# Altium schematic symbol library Regulator_Linear.SchLib: 1538 symbols (part 2 of 9)
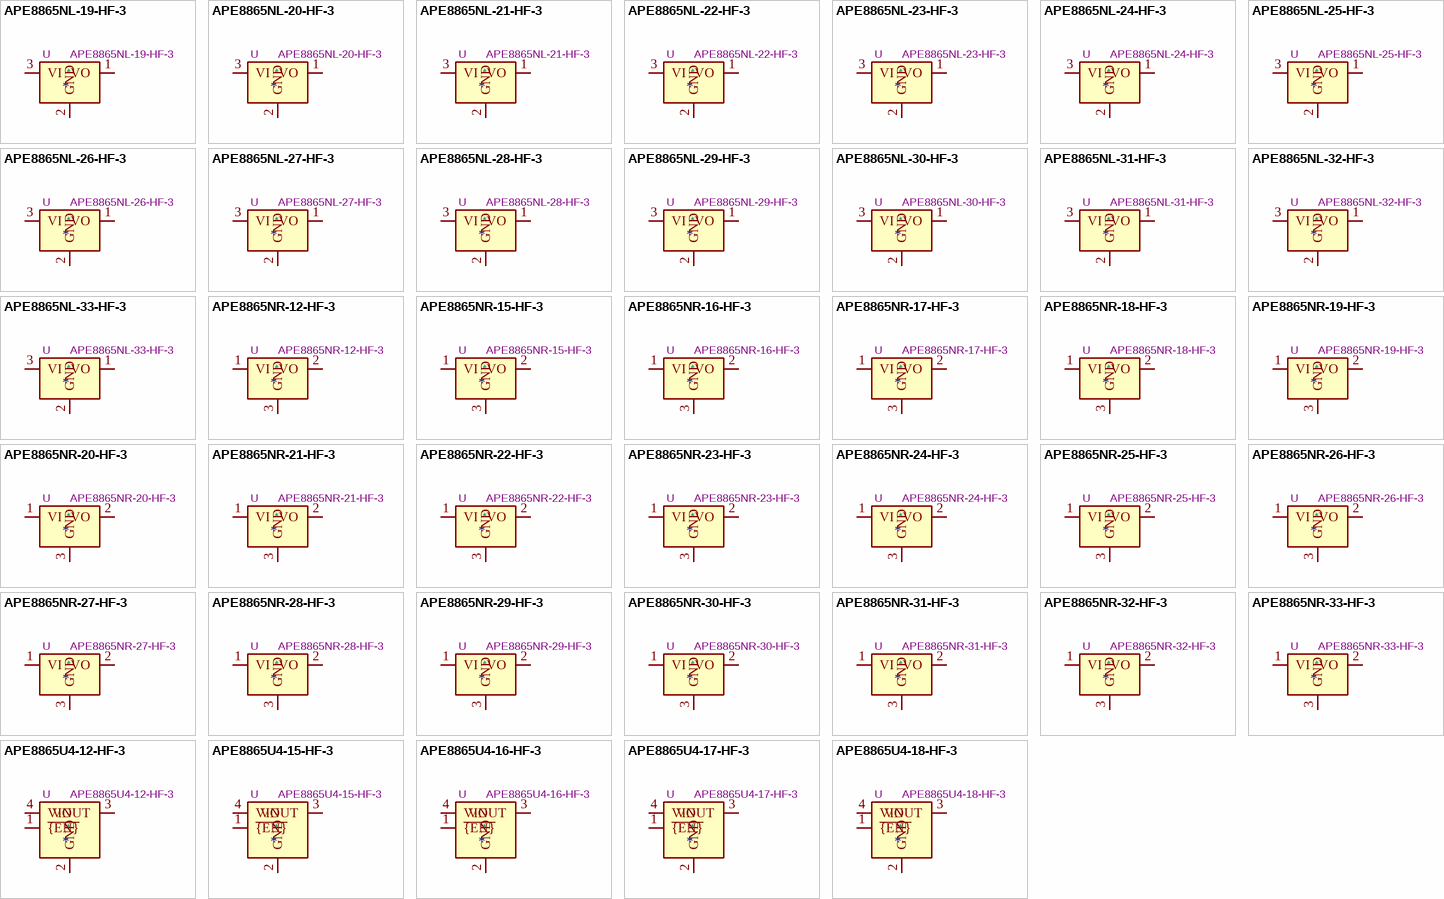
[diagram p39: symbols APE8865NL-19-HF-3 to APE8865U4-18-HF-3]

## APE8865NR-19-HF-3
designator *  value APE8865NR-19-HF-3  Reference: U
ki_keywords: 300mA LDO Regulator Fixed Positive; ki_description: 300mA Low Dropout Voltage Regulator, Fixed Output 1.9V, SOT-23; ki_fp_filters: SOT?23*; Footprint: Package_TO_SOT_SMD:SOT-23; Datasheet: http://www.tme.eu/fr/Document/ced3461ed31ea70a3c416fb648e0cde7/APE8865-3.pdf
pins: 1 VI, 2 VO, 3 GND

## APE8865NR-20-HF-3
designator *  value APE8865NR-20-HF-3  Reference: U
ki_keywords: 300mA LDO Regulator Fixed Positive; ki_description: 300mA Low Dropout Voltage Regulator, Fixed Output 2.0V, SOT-23; ki_fp_filters: SOT?23*; Footprint: Package_TO_SOT_SMD:SOT-23; Datasheet: http://www.tme.eu/fr/Document/ced3461ed31ea70a3c416fb648e0cde7/APE8865-3.pdf
pins: 1 VI, 2 VO, 3 GND

## APE8865NR-21-HF-3
designator *  value APE8865NR-21-HF-3  Reference: U
ki_keywords: 300mA LDO Regulator Fixed Positive; ki_description: 300mA Low Dropout Voltage Regulator, Fixed Output 2.1V, SOT-23; ki_fp_filters: SOT?23*; Footprint: Package_TO_SOT_SMD:SOT-23; Datasheet: http://www.tme.eu/fr/Document/ced3461ed31ea70a3c416fb648e0cde7/APE8865-3.pdf
pins: 1 VI, 2 VO, 3 GND

## APE8865NR-22-HF-3
designator *  value APE8865NR-22-HF-3  Reference: U
ki_keywords: 300mA LDO Regulator Fixed Positive; ki_description: 300mA Low Dropout Voltage Regulator, Fixed Output 2.2V, SOT-23; ki_fp_filters: SOT?23*; Footprint: Package_TO_SOT_SMD:SOT-23; Datasheet: http://www.tme.eu/fr/Document/ced3461ed31ea70a3c416fb648e0cde7/APE8865-3.pdf
pins: 1 VI, 2 VO, 3 GND

## APE8865NR-23-HF-3
designator *  value APE8865NR-23-HF-3  Reference: U
ki_keywords: 300mA LDO Regulator Fixed Positive; ki_description: 300mA Low Dropout Voltage Regulator, Fixed Output 2.3V, SOT-23; ki_fp_filters: SOT?23*; Footprint: Package_TO_SOT_SMD:SOT-23; Datasheet: http://www.tme.eu/fr/Document/ced3461ed31ea70a3c416fb648e0cde7/APE8865-3.pdf
pins: 1 VI, 2 VO, 3 GND

## APE8865NR-24-HF-3
designator *  value APE8865NR-24-HF-3  Reference: U
ki_keywords: 300mA LDO Regulator Fixed Positive; ki_description: 300mA Low Dropout Voltage Regulator, Fixed Output 2.4V, SOT-23; ki_fp_filters: SOT?23*; Footprint: Package_TO_SOT_SMD:SOT-23; Datasheet: http://www.tme.eu/fr/Document/ced3461ed31ea70a3c416fb648e0cde7/APE8865-3.pdf
pins: 1 VI, 2 VO, 3 GND

## APE8865NR-25-HF-3
designator *  value APE8865NR-25-HF-3  Reference: U
ki_keywords: 300mA LDO Regulator Fixed Positive; ki_description: 300mA Low Dropout Voltage Regulator, Fixed Output 2.5V, SOT-23; ki_fp_filters: SOT?23*; Footprint: Package_TO_SOT_SMD:SOT-23; Datasheet: http://www.tme.eu/fr/Document/ced3461ed31ea70a3c416fb648e0cde7/APE8865-3.pdf
pins: 1 VI, 2 VO, 3 GND

## APE8865NR-26-HF-3
designator *  value APE8865NR-26-HF-3  Reference: U
ki_keywords: 300mA LDO Regulator Fixed Positive; ki_description: 300mA Low Dropout Voltage Regulator, Fixed Output 2.6V, SOT-23; ki_fp_filters: SOT?23*; Footprint: Package_TO_SOT_SMD:SOT-23; Datasheet: http://www.tme.eu/fr/Document/ced3461ed31ea70a3c416fb648e0cde7/APE8865-3.pdf
pins: 1 VI, 2 VO, 3 GND

## APE8865NR-27-HF-3
designator *  value APE8865NR-27-HF-3  Reference: U
ki_keywords: 300mA LDO Regulator Fixed Positive; ki_description: 300mA Low Dropout Voltage Regulator, Fixed Output 2.7V, SOT-23; ki_fp_filters: SOT?23*; Footprint: Package_TO_SOT_SMD:SOT-23; Datasheet: http://www.tme.eu/fr/Document/ced3461ed31ea70a3c416fb648e0cde7/APE8865-3.pdf
pins: 1 VI, 2 VO, 3 GND

## APE8865NR-28-HF-3
designator *  value APE8865NR-28-HF-3  Reference: U
ki_keywords: 300mA LDO Regulator Fixed Positive; ki_description: 300mA Low Dropout Voltage Regulator, Fixed Output 2.8V, SOT-23; ki_fp_filters: SOT?23*; Footprint: Package_TO_SOT_SMD:SOT-23; Datasheet: http://www.tme.eu/fr/Document/ced3461ed31ea70a3c416fb648e0cde7/APE8865-3.pdf
pins: 1 VI, 2 VO, 3 GND

## APE8865NR-29-HF-3
designator *  value APE8865NR-29-HF-3  Reference: U
ki_keywords: 300mA LDO Regulator Fixed Positive; ki_description: 300mA Low Dropout Voltage Regulator, Fixed Output 2.9V, SOT-23; ki_fp_filters: SOT?23*; Footprint: Package_TO_SOT_SMD:SOT-23; Datasheet: http://www.tme.eu/fr/Document/ced3461ed31ea70a3c416fb648e0cde7/APE8865-3.pdf
pins: 1 VI, 2 VO, 3 GND

## APE8865NR-30-HF-3
designator *  value APE8865NR-30-HF-3  Reference: U
ki_keywords: 300mA LDO Regulator Fixed Positive; ki_description: 300mA Low Dropout Voltage Regulator, Fixed Output 3.0V, SOT-23; ki_fp_filters: SOT?23*; Footprint: Package_TO_SOT_SMD:SOT-23; Datasheet: http://www.tme.eu/fr/Document/ced3461ed31ea70a3c416fb648e0cde7/APE8865-3.pdf
pins: 1 VI, 2 VO, 3 GND

## APE8865NR-31-HF-3
designator *  value APE8865NR-31-HF-3  Reference: U
ki_keywords: 300mA LDO Regulator Fixed Positive; ki_description: 300mA Low Dropout Voltage Regulator, Fixed Output 3.1V, SOT-23; ki_fp_filters: SOT?23*; Footprint: Package_TO_SOT_SMD:SOT-23; Datasheet: http://www.tme.eu/fr/Document/ced3461ed31ea70a3c416fb648e0cde7/APE8865-3.pdf
pins: 1 VI, 2 VO, 3 GND

## APE8865NR-32-HF-3
designator *  value APE8865NR-32-HF-3  Reference: U
ki_keywords: 300mA LDO Regulator Fixed Positive; ki_description: 300mA Low Dropout Voltage Regulator, Fixed Output 3.2V, SOT-23; ki_fp_filters: SOT?23*; Footprint: Package_TO_SOT_SMD:SOT-23; Datasheet: http://www.tme.eu/fr/Document/ced3461ed31ea70a3c416fb648e0cde7/APE8865-3.pdf
pins: 1 VI, 2 VO, 3 GND

## APE8865NR-33-HF-3
designator *  value APE8865NR-33-HF-3  Reference: U
ki_keywords: 300mA LDO Regulator Fixed Positive; ki_description: 300mA Low Dropout Voltage Regulator, Fixed Output 3.3V, SOT-23; ki_fp_filters: SOT?23*; Footprint: Package_TO_SOT_SMD:SOT-23; Datasheet: http://www.tme.eu/fr/Document/ced3461ed31ea70a3c416fb648e0cde7/APE8865-3.pdf
pins: 1 VI, 2 VO, 3 GND

## APE8865U4-12-HF-3
designator *  value APE8865U4-12-HF-3  Reference: U
ki_keywords: 300mA LDO Regulator Fixed Positive; ki_description: 300mA Low Dropout Voltage Regulator, Fixed Output 1.2V, SC-70-4; ki_fp_filters: *SC?70*; Footprint: Package_TO_SOT_SMD:SOT-343_SC-70-4; Datasheet: http://www.tme.eu/fr/Document/ced3461ed31ea70a3c416fb648e0cde7/APE8865-3.pdf
pins: 1 ~{{EN}}, 2 GND, 3 VOUT, 4 VIN

## APE8865U4-15-HF-3
designator *  value APE8865U4-15-HF-3  Reference: U
ki_keywords: 300mA LDO Regulator Fixed Positive; ki_description: 300mA Low Dropout Voltage Regulator, Fixed Output 1.5V, SC-70-4; ki_fp_filters: *SC?70*; Footprint: Package_TO_SOT_SMD:SOT-343_SC-70-4; Datasheet: http://www.tme.eu/fr/Document/ced3461ed31ea70a3c416fb648e0cde7/APE8865-3.pdf
pins: 1 ~{{EN}}, 2 GND, 3 VOUT, 4 VIN

## APE8865U4-16-HF-3
designator *  value APE8865U4-16-HF-3  Reference: U
ki_keywords: 300mA LDO Regulator Fixed Positive; ki_description: 300mA Low Dropout Voltage Regulator, Fixed Output 1.6V, SC-70-4; ki_fp_filters: *SC?70*; Footprint: Package_TO_SOT_SMD:SOT-343_SC-70-4; Datasheet: http://www.tme.eu/fr/Document/ced3461ed31ea70a3c416fb648e0cde7/APE8865-3.pdf
pins: 1 ~{{EN}}, 2 GND, 3 VOUT, 4 VIN

## APE8865U4-17-HF-3
designator *  value APE8865U4-17-HF-3  Reference: U
ki_keywords: 300mA LDO Regulator Fixed Positive; ki_description: 300mA Low Dropout Voltage Regulator, Fixed Output 1.7V, SC-70-4; ki_fp_filters: *SC?70*; Footprint: Package_TO_SOT_SMD:SOT-343_SC-70-4; Datasheet: http://www.tme.eu/fr/Document/ced3461ed31ea70a3c416fb648e0cde7/APE8865-3.pdf
pins: 1 ~{{EN}}, 2 GND, 3 VOUT, 4 VIN

## APE8865U4-18-HF-3
designator *  value APE8865U4-18-HF-3  Reference: U
ki_keywords: 300mA LDO Regulator Fixed Positive; ki_description: 300mA Low Dropout Voltage Regulator, Fixed Output 1.8V, SC-70-4; ki_fp_filters: *SC?70*; Footprint: Package_TO_SOT_SMD:SOT-343_SC-70-4; Datasheet: http://www.tme.eu/fr/Document/ced3461ed31ea70a3c416fb648e0cde7/APE8865-3.pdf
pins: 1 ~{{EN}}, 2 GND, 3 VOUT, 4 VIN

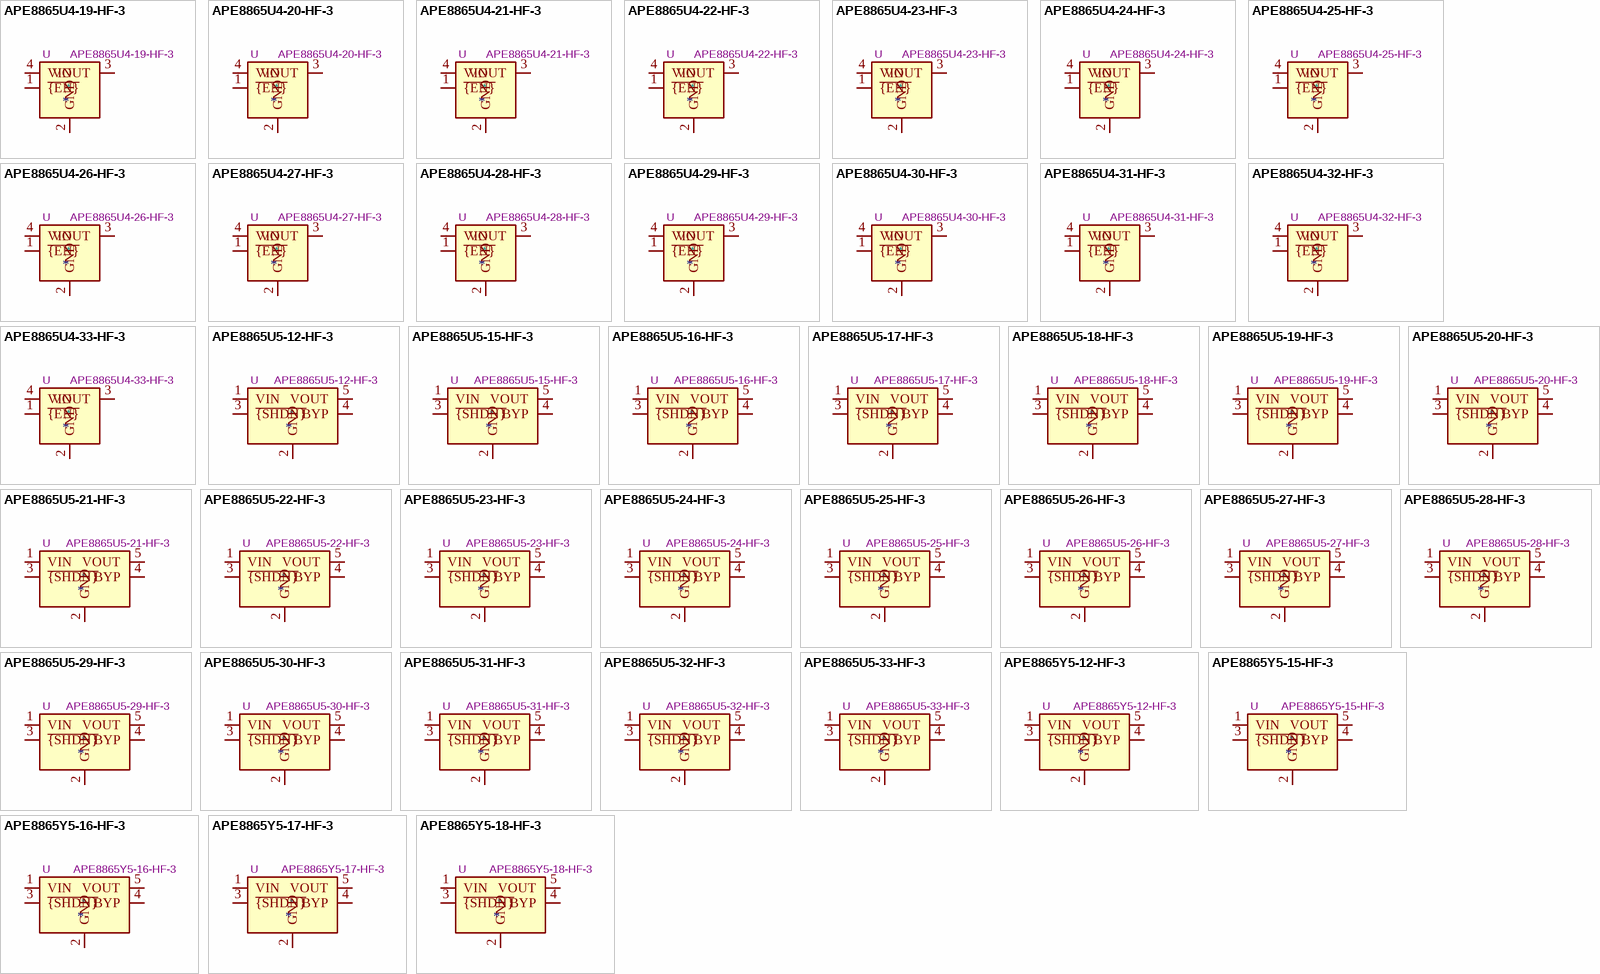
[diagram p5: symbols APE8865U4-19-HF-3 to APE8865Y5-18-HF-3]

## APE8865U4-19-HF-3
designator *  value APE8865U4-19-HF-3  Reference: U
ki_keywords: 300mA LDO Regulator Fixed Positive; ki_description: 300mA Low Dropout Voltage Regulator, Fixed Output 1.9V, SC-70-4; ki_fp_filters: *SC?70*; Footprint: Package_TO_SOT_SMD:SOT-343_SC-70-4; Datasheet: http://www.tme.eu/fr/Document/ced3461ed31ea70a3c416fb648e0cde7/APE8865-3.pdf
pins: 1 ~{{EN}}, 2 GND, 3 VOUT, 4 VIN

## APE8865U4-20-HF-3
designator *  value APE8865U4-20-HF-3  Reference: U
ki_keywords: 300mA LDO Regulator Fixed Positive; ki_description: 300mA Low Dropout Voltage Regulator, Fixed Output 2.0V, SC-70-4; ki_fp_filters: *SC?70*; Footprint: Package_TO_SOT_SMD:SOT-343_SC-70-4; Datasheet: http://www.tme.eu/fr/Document/ced3461ed31ea70a3c416fb648e0cde7/APE8865-3.pdf
pins: 1 ~{{EN}}, 2 GND, 3 VOUT, 4 VIN

## APE8865U4-21-HF-3
designator *  value APE8865U4-21-HF-3  Reference: U
ki_keywords: 300mA LDO Regulator Fixed Positive; ki_description: 300mA Low Dropout Voltage Regulator, Fixed Output 2.1V, SC-70-4; ki_fp_filters: *SC?70*; Footprint: Package_TO_SOT_SMD:SOT-343_SC-70-4; Datasheet: http://www.tme.eu/fr/Document/ced3461ed31ea70a3c416fb648e0cde7/APE8865-3.pdf
pins: 1 ~{{EN}}, 2 GND, 3 VOUT, 4 VIN

## APE8865U4-22-HF-3
designator *  value APE8865U4-22-HF-3  Reference: U
ki_keywords: 300mA LDO Regulator Fixed Positive; ki_description: 300mA Low Dropout Voltage Regulator, Fixed Output 2.2V, SC-70-4; ki_fp_filters: *SC?70*; Footprint: Package_TO_SOT_SMD:SOT-343_SC-70-4; Datasheet: http://www.tme.eu/fr/Document/ced3461ed31ea70a3c416fb648e0cde7/APE8865-3.pdf
pins: 1 ~{{EN}}, 2 GND, 3 VOUT, 4 VIN

## APE8865U4-23-HF-3
designator *  value APE8865U4-23-HF-3  Reference: U
ki_keywords: 300mA LDO Regulator Fixed Positive; ki_description: 300mA Low Dropout Voltage Regulator, Fixed Output 2.3V, SC-70-4; ki_fp_filters: *SC?70*; Footprint: Package_TO_SOT_SMD:SOT-343_SC-70-4; Datasheet: http://www.tme.eu/fr/Document/ced3461ed31ea70a3c416fb648e0cde7/APE8865-3.pdf
pins: 1 ~{{EN}}, 2 GND, 3 VOUT, 4 VIN

## APE8865U4-24-HF-3
designator *  value APE8865U4-24-HF-3  Reference: U
ki_keywords: 300mA LDO Regulator Fixed Positive; ki_description: 300mA Low Dropout Voltage Regulator, Fixed Output 2.4V, SC-70-4; ki_fp_filters: *SC?70*; Footprint: Package_TO_SOT_SMD:SOT-343_SC-70-4; Datasheet: http://www.tme.eu/fr/Document/ced3461ed31ea70a3c416fb648e0cde7/APE8865-3.pdf
pins: 1 ~{{EN}}, 2 GND, 3 VOUT, 4 VIN

## APE8865U4-25-HF-3
designator *  value APE8865U4-25-HF-3  Reference: U
ki_keywords: 300mA LDO Regulator Fixed Positive; ki_description: 300mA Low Dropout Voltage Regulator, Fixed Output 2.5V, SC-70-4; ki_fp_filters: *SC?70*; Footprint: Package_TO_SOT_SMD:SOT-343_SC-70-4; Datasheet: http://www.tme.eu/fr/Document/ced3461ed31ea70a3c416fb648e0cde7/APE8865-3.pdf
pins: 1 ~{{EN}}, 2 GND, 3 VOUT, 4 VIN

## APE8865U4-26-HF-3
designator *  value APE8865U4-26-HF-3  Reference: U
ki_keywords: 300mA LDO Regulator Fixed Positive; ki_description: 300mA Low Dropout Voltage Regulator, Fixed Output 2.6V, SC-70-4; ki_fp_filters: *SC?70*; Footprint: Package_TO_SOT_SMD:SOT-343_SC-70-4; Datasheet: http://www.tme.eu/fr/Document/ced3461ed31ea70a3c416fb648e0cde7/APE8865-3.pdf
pins: 1 ~{{EN}}, 2 GND, 3 VOUT, 4 VIN

## APE8865U4-27-HF-3
designator *  value APE8865U4-27-HF-3  Reference: U
ki_keywords: 300mA LDO Regulator Fixed Positive; ki_description: 300mA Low Dropout Voltage Regulator, Fixed Output 2.7V, SC-70-4; ki_fp_filters: *SC?70*; Footprint: Package_TO_SOT_SMD:SOT-343_SC-70-4; Datasheet: http://www.tme.eu/fr/Document/ced3461ed31ea70a3c416fb648e0cde7/APE8865-3.pdf
pins: 1 ~{{EN}}, 2 GND, 3 VOUT, 4 VIN

## APE8865U4-28-HF-3
designator *  value APE8865U4-28-HF-3  Reference: U
ki_keywords: 300mA LDO Regulator Fixed Positive; ki_description: 300mA Low Dropout Voltage Regulator, Fixed Output 2.8V, SC-70-4; ki_fp_filters: *SC?70*; Footprint: Package_TO_SOT_SMD:SOT-343_SC-70-4; Datasheet: http://www.tme.eu/fr/Document/ced3461ed31ea70a3c416fb648e0cde7/APE8865-3.pdf
pins: 1 ~{{EN}}, 2 GND, 3 VOUT, 4 VIN

## APE8865U4-29-HF-3
designator *  value APE8865U4-29-HF-3  Reference: U
ki_keywords: 300mA LDO Regulator Fixed Positive; ki_description: 300mA Low Dropout Voltage Regulator, Fixed Output 2.9V, SC-70-4; ki_fp_filters: *SC?70*; Footprint: Package_TO_SOT_SMD:SOT-343_SC-70-4; Datasheet: http://www.tme.eu/fr/Document/ced3461ed31ea70a3c416fb648e0cde7/APE8865-3.pdf
pins: 1 ~{{EN}}, 2 GND, 3 VOUT, 4 VIN

## APE8865U4-30-HF-3
designator *  value APE8865U4-30-HF-3  Reference: U
ki_keywords: 300mA LDO Regulator Fixed Positive; ki_description: 300mA Low Dropout Voltage Regulator, Fixed Output 3.0V, SC-70-4; ki_fp_filters: *SC?70*; Footprint: Package_TO_SOT_SMD:SOT-343_SC-70-4; Datasheet: http://www.tme.eu/fr/Document/ced3461ed31ea70a3c416fb648e0cde7/APE8865-3.pdf
pins: 1 ~{{EN}}, 2 GND, 3 VOUT, 4 VIN

## APE8865U4-31-HF-3
designator *  value APE8865U4-31-HF-3  Reference: U
ki_keywords: 300mA LDO Regulator Fixed Positive; ki_description: 300mA Low Dropout Voltage Regulator, Fixed Output 3.1V, SC-70-4; ki_fp_filters: *SC?70*; Footprint: Package_TO_SOT_SMD:SOT-343_SC-70-4; Datasheet: http://www.tme.eu/fr/Document/ced3461ed31ea70a3c416fb648e0cde7/APE8865-3.pdf
pins: 1 ~{{EN}}, 2 GND, 3 VOUT, 4 VIN

## APE8865U4-32-HF-3
designator *  value APE8865U4-32-HF-3  Reference: U
ki_keywords: 300mA LDO Regulator Fixed Positive; ki_description: 300mA Low Dropout Voltage Regulator, Fixed Output 3.2V, SC-70-4; ki_fp_filters: *SC?70*; Footprint: Package_TO_SOT_SMD:SOT-343_SC-70-4; Datasheet: http://www.tme.eu/fr/Document/ced3461ed31ea70a3c416fb648e0cde7/APE8865-3.pdf
pins: 1 ~{{EN}}, 2 GND, 3 VOUT, 4 VIN

## APE8865U4-33-HF-3
designator *  value APE8865U4-33-HF-3  Reference: U
ki_keywords: 300mA LDO Regulator Fixed Positive; ki_description: 300mA Low Dropout Voltage Regulator, Fixed Output 3.3V, SC-70-4; ki_fp_filters: *SC?70*; Footprint: Package_TO_SOT_SMD:SOT-343_SC-70-4; Datasheet: http://www.tme.eu/fr/Document/ced3461ed31ea70a3c416fb648e0cde7/APE8865-3.pdf
pins: 1 ~{{EN}}, 2 GND, 3 VOUT, 4 VIN

## APE8865U5-12-HF-3
designator *  value APE8865U5-12-HF-3  Reference: U
ki_keywords: 300mA LDO Regulator Fixed Positive; ki_description: 300mA Low Dropout Voltage Regulator, Fixed Output 1.2V, SC-70-5; ki_fp_filters: *SC?70*; Footprint: Package_TO_SOT_SMD:SOT-353_SC-70-5; Datasheet: http://www.tme.eu/fr/Document/ced3461ed31ea70a3c416fb648e0cde7/APE8865-3.pdf
pins: 1 VIN, 2 GND, 3 ~{{SHDN}}, 4 BYP, 5 VOUT

## APE8865U5-15-HF-3
designator *  value APE8865U5-15-HF-3  Reference: U
ki_keywords: 300mA LDO Regulator Fixed Positive; ki_description: 300mA Low Dropout Voltage Regulator, Fixed Output 1.5V, SC-70-5; ki_fp_filters: *SC?70*; Footprint: Package_TO_SOT_SMD:SOT-353_SC-70-5; Datasheet: http://www.tme.eu/fr/Document/ced3461ed31ea70a3c416fb648e0cde7/APE8865-3.pdf
pins: 1 VIN, 2 GND, 3 ~{{SHDN}}, 4 BYP, 5 VOUT

## APE8865U5-16-HF-3
designator *  value APE8865U5-16-HF-3  Reference: U
ki_keywords: 300mA LDO Regulator Fixed Positive; ki_description: 300mA Low Dropout Voltage Regulator, Fixed Output 1.6V, SC-70-5; ki_fp_filters: *SC?70*; Footprint: Package_TO_SOT_SMD:SOT-353_SC-70-5; Datasheet: http://www.tme.eu/fr/Document/ced3461ed31ea70a3c416fb648e0cde7/APE8865-3.pdf
pins: 1 VIN, 2 GND, 3 ~{{SHDN}}, 4 BYP, 5 VOUT

## APE8865U5-17-HF-3
designator *  value APE8865U5-17-HF-3  Reference: U
ki_keywords: 300mA LDO Regulator Fixed Positive; ki_description: 300mA Low Dropout Voltage Regulator, Fixed Output 1.7V, SC-70-5; ki_fp_filters: *SC?70*; Footprint: Package_TO_SOT_SMD:SOT-353_SC-70-5; Datasheet: http://www.tme.eu/fr/Document/ced3461ed31ea70a3c416fb648e0cde7/APE8865-3.pdf
pins: 1 VIN, 2 GND, 3 ~{{SHDN}}, 4 BYP, 5 VOUT

## APE8865U5-18-HF-3
designator *  value APE8865U5-18-HF-3  Reference: U
ki_keywords: 300mA LDO Regulator Fixed Positive; ki_description: 300mA Low Dropout Voltage Regulator, Fixed Output 1.8V, SC-70-5; ki_fp_filters: *SC?70*; Footprint: Package_TO_SOT_SMD:SOT-353_SC-70-5; Datasheet: http://www.tme.eu/fr/Document/ced3461ed31ea70a3c416fb648e0cde7/APE8865-3.pdf
pins: 1 VIN, 2 GND, 3 ~{{SHDN}}, 4 BYP, 5 VOUT

## APE8865U5-19-HF-3
designator *  value APE8865U5-19-HF-3  Reference: U
ki_keywords: 300mA LDO Regulator Fixed Positive; ki_description: 300mA Low Dropout Voltage Regulator, Fixed Output 1.9V, SC-70-5; ki_fp_filters: *SC?70*; Footprint: Package_TO_SOT_SMD:SOT-353_SC-70-5; Datasheet: http://www.tme.eu/fr/Document/ced3461ed31ea70a3c416fb648e0cde7/APE8865-3.pdf
pins: 1 VIN, 2 GND, 3 ~{{SHDN}}, 4 BYP, 5 VOUT

## APE8865U5-20-HF-3
designator *  value APE8865U5-20-HF-3  Reference: U
ki_keywords: 300mA LDO Regulator Fixed Positive; ki_description: 300mA Low Dropout Voltage Regulator, Fixed Output 2.0V, SC-70-5; ki_fp_filters: *SC?70*; Footprint: Package_TO_SOT_SMD:SOT-353_SC-70-5; Datasheet: http://www.tme.eu/fr/Document/ced3461ed31ea70a3c416fb648e0cde7/APE8865-3.pdf
pins: 1 VIN, 2 GND, 3 ~{{SHDN}}, 4 BYP, 5 VOUT

## APE8865U5-21-HF-3
designator *  value APE8865U5-21-HF-3  Reference: U
ki_keywords: 300mA LDO Regulator Fixed Positive; ki_description: 300mA Low Dropout Voltage Regulator, Fixed Output 2.1V, SC-70-5; ki_fp_filters: *SC?70*; Footprint: Package_TO_SOT_SMD:SOT-353_SC-70-5; Datasheet: http://www.tme.eu/fr/Document/ced3461ed31ea70a3c416fb648e0cde7/APE8865-3.pdf
pins: 1 VIN, 2 GND, 3 ~{{SHDN}}, 4 BYP, 5 VOUT

## APE8865U5-22-HF-3
designator *  value APE8865U5-22-HF-3  Reference: U
ki_keywords: 300mA LDO Regulator Fixed Positive; ki_description: 300mA Low Dropout Voltage Regulator, Fixed Output 2.2V, SC-70-5; ki_fp_filters: *SC?70*; Footprint: Package_TO_SOT_SMD:SOT-353_SC-70-5; Datasheet: http://www.tme.eu/fr/Document/ced3461ed31ea70a3c416fb648e0cde7/APE8865-3.pdf
pins: 1 VIN, 2 GND, 3 ~{{SHDN}}, 4 BYP, 5 VOUT

## APE8865U5-23-HF-3
designator *  value APE8865U5-23-HF-3  Reference: U
ki_keywords: 300mA LDO Regulator Fixed Positive; ki_description: 300mA Low Dropout Voltage Regulator, Fixed Output 2.3V, SC-70-5; ki_fp_filters: *SC?70*; Footprint: Package_TO_SOT_SMD:SOT-353_SC-70-5; Datasheet: http://www.tme.eu/fr/Document/ced3461ed31ea70a3c416fb648e0cde7/APE8865-3.pdf
pins: 1 VIN, 2 GND, 3 ~{{SHDN}}, 4 BYP, 5 VOUT

## APE8865U5-24-HF-3
designator *  value APE8865U5-24-HF-3  Reference: U
ki_keywords: 300mA LDO Regulator Fixed Positive; ki_description: 300mA Low Dropout Voltage Regulator, Fixed Output 2.4V, SC-70-5; ki_fp_filters: *SC?70*; Footprint: Package_TO_SOT_SMD:SOT-353_SC-70-5; Datasheet: http://www.tme.eu/fr/Document/ced3461ed31ea70a3c416fb648e0cde7/APE8865-3.pdf
pins: 1 VIN, 2 GND, 3 ~{{SHDN}}, 4 BYP, 5 VOUT

## APE8865U5-25-HF-3
designator *  value APE8865U5-25-HF-3  Reference: U
ki_keywords: 300mA LDO Regulator Fixed Positive; ki_description: 300mA Low Dropout Voltage Regulator, Fixed Output 2.5V, SC-70-5; ki_fp_filters: *SC?70*; Footprint: Package_TO_SOT_SMD:SOT-353_SC-70-5; Datasheet: http://www.tme.eu/fr/Document/ced3461ed31ea70a3c416fb648e0cde7/APE8865-3.pdf
pins: 1 VIN, 2 GND, 3 ~{{SHDN}}, 4 BYP, 5 VOUT

## APE8865U5-26-HF-3
designator *  value APE8865U5-26-HF-3  Reference: U
ki_keywords: 300mA LDO Regulator Fixed Positive; ki_description: 300mA Low Dropout Voltage Regulator, Fixed Output 2.6V, SC-70-5; ki_fp_filters: *SC?70*; Footprint: Package_TO_SOT_SMD:SOT-353_SC-70-5; Datasheet: http://www.tme.eu/fr/Document/ced3461ed31ea70a3c416fb648e0cde7/APE8865-3.pdf
pins: 1 VIN, 2 GND, 3 ~{{SHDN}}, 4 BYP, 5 VOUT

## APE8865U5-27-HF-3
designator *  value APE8865U5-27-HF-3  Reference: U
ki_keywords: 300mA LDO Regulator Fixed Positive; ki_description: 300mA Low Dropout Voltage Regulator, Fixed Output 2.7V, SC-70-5; ki_fp_filters: *SC?70*; Footprint: Package_TO_SOT_SMD:SOT-353_SC-70-5; Datasheet: http://www.tme.eu/fr/Document/ced3461ed31ea70a3c416fb648e0cde7/APE8865-3.pdf
pins: 1 VIN, 2 GND, 3 ~{{SHDN}}, 4 BYP, 5 VOUT

## APE8865U5-28-HF-3
designator *  value APE8865U5-28-HF-3  Reference: U
ki_keywords: 300mA LDO Regulator Fixed Positive; ki_description: 300mA Low Dropout Voltage Regulator, Fixed Output 2.8V, SC-70-5; ki_fp_filters: *SC?70*; Footprint: Package_TO_SOT_SMD:SOT-353_SC-70-5; Datasheet: http://www.tme.eu/fr/Document/ced3461ed31ea70a3c416fb648e0cde7/APE8865-3.pdf
pins: 1 VIN, 2 GND, 3 ~{{SHDN}}, 4 BYP, 5 VOUT

## APE8865U5-29-HF-3
designator *  value APE8865U5-29-HF-3  Reference: U
ki_keywords: 300mA LDO Regulator Fixed Positive; ki_description: 300mA Low Dropout Voltage Regulator, Fixed Output 2.9V, SC-70-5; ki_fp_filters: *SC?70*; Footprint: Package_TO_SOT_SMD:SOT-353_SC-70-5; Datasheet: http://www.tme.eu/fr/Document/ced3461ed31ea70a3c416fb648e0cde7/APE8865-3.pdf
pins: 1 VIN, 2 GND, 3 ~{{SHDN}}, 4 BYP, 5 VOUT

## APE8865U5-30-HF-3
designator *  value APE8865U5-30-HF-3  Reference: U
ki_keywords: 300mA LDO Regulator Fixed Positive; ki_description: 300mA Low Dropout Voltage Regulator, Fixed Output 3.0V, SC-70-5; ki_fp_filters: *SC?70*; Footprint: Package_TO_SOT_SMD:SOT-353_SC-70-5; Datasheet: http://www.tme.eu/fr/Document/ced3461ed31ea70a3c416fb648e0cde7/APE8865-3.pdf
pins: 1 VIN, 2 GND, 3 ~{{SHDN}}, 4 BYP, 5 VOUT

## APE8865U5-31-HF-3
designator *  value APE8865U5-31-HF-3  Reference: U
ki_keywords: 300mA LDO Regulator Fixed Positive; ki_description: 300mA Low Dropout Voltage Regulator, Fixed Output 3.1V, SC-70-5; ki_fp_filters: *SC?70*; Footprint: Package_TO_SOT_SMD:SOT-353_SC-70-5; Datasheet: http://www.tme.eu/fr/Document/ced3461ed31ea70a3c416fb648e0cde7/APE8865-3.pdf
pins: 1 VIN, 2 GND, 3 ~{{SHDN}}, 4 BYP, 5 VOUT

## APE8865U5-32-HF-3
designator *  value APE8865U5-32-HF-3  Reference: U
ki_keywords: 300mA LDO Regulator Fixed Positive; ki_description: 300mA Low Dropout Voltage Regulator, Fixed Output 3.2V, SC-70-5; ki_fp_filters: *SC?70*; Footprint: Package_TO_SOT_SMD:SOT-353_SC-70-5; Datasheet: http://www.tme.eu/fr/Document/ced3461ed31ea70a3c416fb648e0cde7/APE8865-3.pdf
pins: 1 VIN, 2 GND, 3 ~{{SHDN}}, 4 BYP, 5 VOUT

## APE8865U5-33-HF-3
designator *  value APE8865U5-33-HF-3  Reference: U
ki_keywords: 300mA LDO Regulator Fixed Positive; ki_description: 300mA Low Dropout Voltage Regulator, Fixed Output 3.3V, SC-70-5; ki_fp_filters: *SC?70*; Footprint: Package_TO_SOT_SMD:SOT-353_SC-70-5; Datasheet: http://www.tme.eu/fr/Document/ced3461ed31ea70a3c416fb648e0cde7/APE8865-3.pdf
pins: 1 VIN, 2 GND, 3 ~{{SHDN}}, 4 BYP, 5 VOUT

## APE8865Y5-12-HF-3
designator *  value APE8865Y5-12-HF-3  Reference: U
ki_keywords: 300mA LDO Regulator Fixed Positive; ki_description: 300mA Low Dropout Voltage Regulator, Fixed Output 1.2V, SOT-23-5; ki_fp_filters: SOT?23*; Footprint: Package_TO_SOT_SMD:SOT-23-5; Datasheet: http://www.tme.eu/fr/Document/ced3461ed31ea70a3c416fb648e0cde7/APE8865-3.pdf
pins: 1 VIN, 2 GND, 3 ~{{SHDN}}, 4 BYP, 5 VOUT

## APE8865Y5-15-HF-3
designator *  value APE8865Y5-15-HF-3  Reference: U
ki_keywords: 300mA LDO Regulator Fixed Positive; ki_description: 300mA Low Dropout Voltage Regulator, Fixed Output 1.5V, SOT-23-5; ki_fp_filters: SOT?23*; Footprint: Package_TO_SOT_SMD:SOT-23-5; Datasheet: http://www.tme.eu/fr/Document/ced3461ed31ea70a3c416fb648e0cde7/APE8865-3.pdf
pins: 1 VIN, 2 GND, 3 ~{{SHDN}}, 4 BYP, 5 VOUT

## APE8865Y5-16-HF-3
designator *  value APE8865Y5-16-HF-3  Reference: U
ki_keywords: 300mA LDO Regulator Fixed Positive; ki_description: 300mA Low Dropout Voltage Regulator, Fixed Output 1.6V, SOT-23-5; ki_fp_filters: SOT?23*; Footprint: Package_TO_SOT_SMD:SOT-23-5; Datasheet: http://www.tme.eu/fr/Document/ced3461ed31ea70a3c416fb648e0cde7/APE8865-3.pdf
pins: 1 VIN, 2 GND, 3 ~{{SHDN}}, 4 BYP, 5 VOUT

## APE8865Y5-17-HF-3
designator *  value APE8865Y5-17-HF-3  Reference: U
ki_keywords: 300mA LDO Regulator Fixed Positive; ki_description: 300mA Low Dropout Voltage Regulator, Fixed Output 1.7V, SOT-23-5; ki_fp_filters: SOT?23*; Footprint: Package_TO_SOT_SMD:SOT-23-5; Datasheet: http://www.tme.eu/fr/Document/ced3461ed31ea70a3c416fb648e0cde7/APE8865-3.pdf
pins: 1 VIN, 2 GND, 3 ~{{SHDN}}, 4 BYP, 5 VOUT

## APE8865Y5-18-HF-3
designator *  value APE8865Y5-18-HF-3  Reference: U
ki_keywords: 300mA LDO Regulator Fixed Positive; ki_description: 300mA Low Dropout Voltage Regulator, Fixed Output 1.8V, SOT-23-5; ki_fp_filters: SOT?23*; Footprint: Package_TO_SOT_SMD:SOT-23-5; Datasheet: http://www.tme.eu/fr/Document/ced3461ed31ea70a3c416fb648e0cde7/APE8865-3.pdf
pins: 1 VIN, 2 GND, 3 ~{{SHDN}}, 4 BYP, 5 VOUT

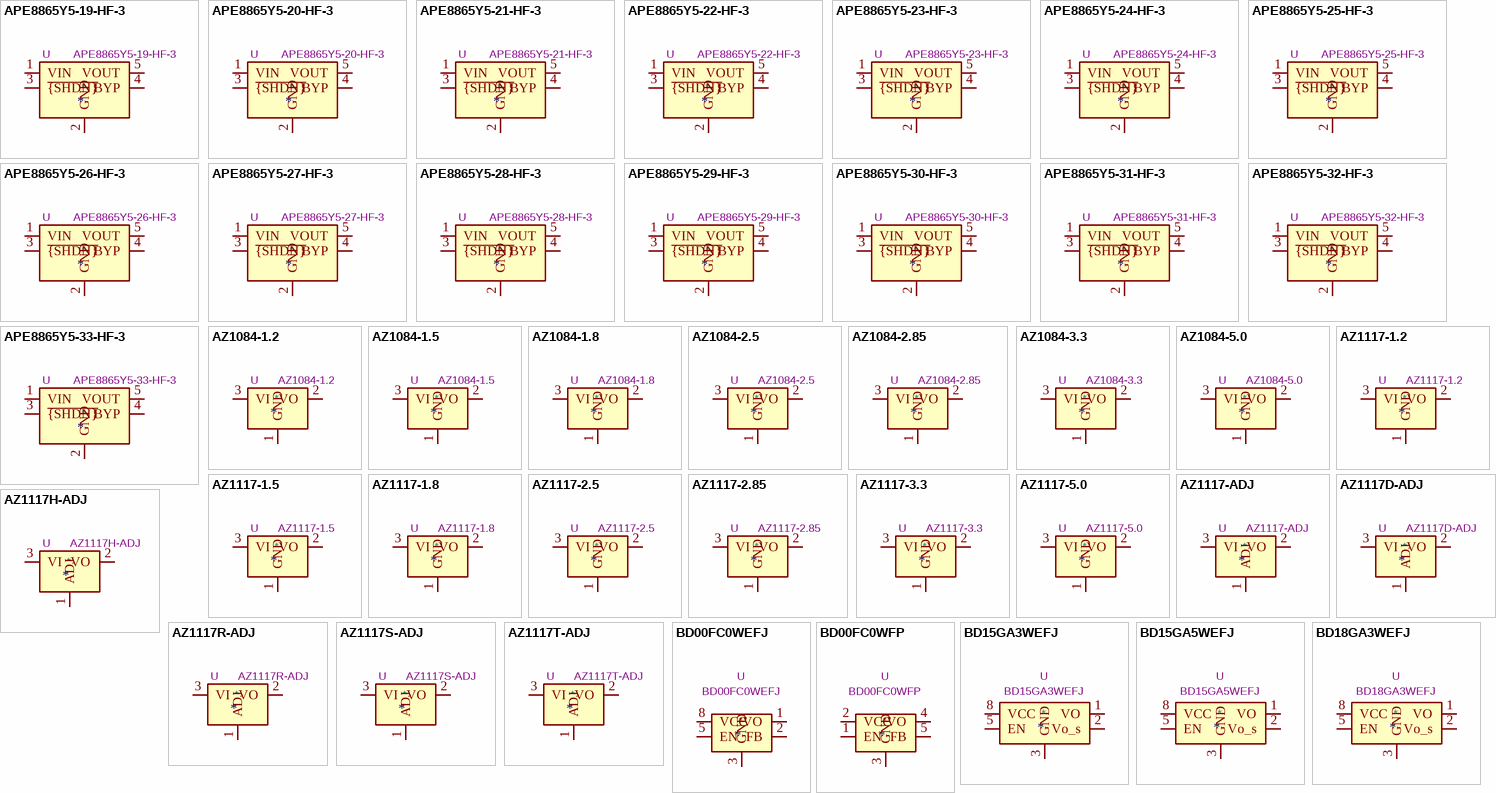
[diagram p6: symbols APE8865Y5-19-HF-3 to BD18GA3WEFJ]

## APE8865Y5-19-HF-3
designator *  value APE8865Y5-19-HF-3  Reference: U
ki_keywords: 300mA LDO Regulator Fixed Positive; ki_description: 300mA Low Dropout Voltage Regulator, Fixed Output 1.9V, SOT-23-5; ki_fp_filters: SOT?23*; Footprint: Package_TO_SOT_SMD:SOT-23-5; Datasheet: http://www.tme.eu/fr/Document/ced3461ed31ea70a3c416fb648e0cde7/APE8865-3.pdf
pins: 1 VIN, 2 GND, 3 ~{{SHDN}}, 4 BYP, 5 VOUT

## APE8865Y5-20-HF-3
designator *  value APE8865Y5-20-HF-3  Reference: U
ki_keywords: 300mA LDO Regulator Fixed Positive; ki_description: 300mA Low Dropout Voltage Regulator, Fixed Output 2.0V, SOT-23-5; ki_fp_filters: SOT?23*; Footprint: Package_TO_SOT_SMD:SOT-23-5; Datasheet: http://www.tme.eu/fr/Document/ced3461ed31ea70a3c416fb648e0cde7/APE8865-3.pdf
pins: 1 VIN, 2 GND, 3 ~{{SHDN}}, 4 BYP, 5 VOUT

## APE8865Y5-21-HF-3
designator *  value APE8865Y5-21-HF-3  Reference: U
ki_keywords: 300mA LDO Regulator Fixed Positive; ki_description: 300mA Low Dropout Voltage Regulator, Fixed Output 2.1V, SOT-23-5; ki_fp_filters: SOT?23*; Footprint: Package_TO_SOT_SMD:SOT-23-5; Datasheet: http://www.tme.eu/fr/Document/ced3461ed31ea70a3c416fb648e0cde7/APE8865-3.pdf
pins: 1 VIN, 2 GND, 3 ~{{SHDN}}, 4 BYP, 5 VOUT

## APE8865Y5-22-HF-3
designator *  value APE8865Y5-22-HF-3  Reference: U
ki_keywords: 300mA LDO Regulator Fixed Positive; ki_description: 300mA Low Dropout Voltage Regulator, Fixed Output 2.2V, SOT-23-5; ki_fp_filters: SOT?23*; Footprint: Package_TO_SOT_SMD:SOT-23-5; Datasheet: http://www.tme.eu/fr/Document/ced3461ed31ea70a3c416fb648e0cde7/APE8865-3.pdf
pins: 1 VIN, 2 GND, 3 ~{{SHDN}}, 4 BYP, 5 VOUT

## APE8865Y5-23-HF-3
designator *  value APE8865Y5-23-HF-3  Reference: U
ki_keywords: 300mA LDO Regulator Fixed Positive; ki_description: 300mA Low Dropout Voltage Regulator, Fixed Output 2.3V, SOT-23-5; ki_fp_filters: SOT?23*; Footprint: Package_TO_SOT_SMD:SOT-23-5; Datasheet: http://www.tme.eu/fr/Document/ced3461ed31ea70a3c416fb648e0cde7/APE8865-3.pdf
pins: 1 VIN, 2 GND, 3 ~{{SHDN}}, 4 BYP, 5 VOUT

## APE8865Y5-24-HF-3
designator *  value APE8865Y5-24-HF-3  Reference: U
ki_keywords: 300mA LDO Regulator Fixed Positive; ki_description: 300mA Low Dropout Voltage Regulator, Fixed Output 2.4V, SOT-23-5; ki_fp_filters: SOT?23*; Footprint: Package_TO_SOT_SMD:SOT-23-5; Datasheet: http://www.tme.eu/fr/Document/ced3461ed31ea70a3c416fb648e0cde7/APE8865-3.pdf
pins: 1 VIN, 2 GND, 3 ~{{SHDN}}, 4 BYP, 5 VOUT

## APE8865Y5-25-HF-3
designator *  value APE8865Y5-25-HF-3  Reference: U
ki_keywords: 300mA LDO Regulator Fixed Positive; ki_description: 300mA Low Dropout Voltage Regulator, Fixed Output 2.5V, SOT-23-5; ki_fp_filters: SOT?23*; Footprint: Package_TO_SOT_SMD:SOT-23-5; Datasheet: http://www.tme.eu/fr/Document/ced3461ed31ea70a3c416fb648e0cde7/APE8865-3.pdf
pins: 1 VIN, 2 GND, 3 ~{{SHDN}}, 4 BYP, 5 VOUT

## APE8865Y5-26-HF-3
designator *  value APE8865Y5-26-HF-3  Reference: U
ki_keywords: 300mA LDO Regulator Fixed Positive; ki_description: 300mA Low Dropout Voltage Regulator, Fixed Output 2.6V, SOT-23-5; ki_fp_filters: SOT?23*; Footprint: Package_TO_SOT_SMD:SOT-23-5; Datasheet: http://www.tme.eu/fr/Document/ced3461ed31ea70a3c416fb648e0cde7/APE8865-3.pdf
pins: 1 VIN, 2 GND, 3 ~{{SHDN}}, 4 BYP, 5 VOUT

## APE8865Y5-27-HF-3
designator *  value APE8865Y5-27-HF-3  Reference: U
ki_keywords: 300mA LDO Regulator Fixed Positive; ki_description: 300mA Low Dropout Voltage Regulator, Fixed Output 2.7V, SOT-23-5; ki_fp_filters: SOT?23*; Footprint: Package_TO_SOT_SMD:SOT-23-5; Datasheet: http://www.tme.eu/fr/Document/ced3461ed31ea70a3c416fb648e0cde7/APE8865-3.pdf
pins: 1 VIN, 2 GND, 3 ~{{SHDN}}, 4 BYP, 5 VOUT

## APE8865Y5-28-HF-3
designator *  value APE8865Y5-28-HF-3  Reference: U
ki_keywords: 300mA LDO Regulator Fixed Positive; ki_description: 300mA Low Dropout Voltage Regulator, Fixed Output 2.8V, SOT-23-5; ki_fp_filters: SOT?23*; Footprint: Package_TO_SOT_SMD:SOT-23-5; Datasheet: http://www.tme.eu/fr/Document/ced3461ed31ea70a3c416fb648e0cde7/APE8865-3.pdf
pins: 1 VIN, 2 GND, 3 ~{{SHDN}}, 4 BYP, 5 VOUT

## APE8865Y5-29-HF-3
designator *  value APE8865Y5-29-HF-3  Reference: U
ki_keywords: 300mA LDO Regulator Fixed Positive; ki_description: 300mA Low Dropout Voltage Regulator, Fixed Output 2.9V, SOT-23-5; ki_fp_filters: SOT?23*; Footprint: Package_TO_SOT_SMD:SOT-23-5; Datasheet: http://www.tme.eu/fr/Document/ced3461ed31ea70a3c416fb648e0cde7/APE8865-3.pdf
pins: 1 VIN, 2 GND, 3 ~{{SHDN}}, 4 BYP, 5 VOUT

## APE8865Y5-30-HF-3
designator *  value APE8865Y5-30-HF-3  Reference: U
ki_keywords: 300mA LDO Regulator Fixed Positive; ki_description: 300mA Low Dropout Voltage Regulator, Fixed Output 3.0V, SOT-23-5; ki_fp_filters: SOT?23*; Footprint: Package_TO_SOT_SMD:SOT-23-5; Datasheet: http://www.tme.eu/fr/Document/ced3461ed31ea70a3c416fb648e0cde7/APE8865-3.pdf
pins: 1 VIN, 2 GND, 3 ~{{SHDN}}, 4 BYP, 5 VOUT

## APE8865Y5-31-HF-3
designator *  value APE8865Y5-31-HF-3  Reference: U
ki_keywords: 300mA LDO Regulator Fixed Positive; ki_description: 300mA Low Dropout Voltage Regulator, Fixed Output 3.1V, SOT-23-5; ki_fp_filters: SOT?23*; Footprint: Package_TO_SOT_SMD:SOT-23-5; Datasheet: http://www.tme.eu/fr/Document/ced3461ed31ea70a3c416fb648e0cde7/APE8865-3.pdf
pins: 1 VIN, 2 GND, 3 ~{{SHDN}}, 4 BYP, 5 VOUT

## APE8865Y5-32-HF-3
designator *  value APE8865Y5-32-HF-3  Reference: U
ki_keywords: 300mA LDO Regulator Fixed Positive; ki_description: 300mA Low Dropout Voltage Regulator, Fixed Output 3.2V, SOT-23-5; ki_fp_filters: SOT?23*; Footprint: Package_TO_SOT_SMD:SOT-23-5; Datasheet: http://www.tme.eu/fr/Document/ced3461ed31ea70a3c416fb648e0cde7/APE8865-3.pdf
pins: 1 VIN, 2 GND, 3 ~{{SHDN}}, 4 BYP, 5 VOUT

## APE8865Y5-33-HF-3
designator *  value APE8865Y5-33-HF-3  Reference: U
ki_keywords: 300mA LDO Regulator Fixed Positive; ki_description: 300mA Low Dropout Voltage Regulator, Fixed Output 3.3V, SOT-23-5; ki_fp_filters: SOT?23*; Footprint: Package_TO_SOT_SMD:SOT-23-5; Datasheet: http://www.tme.eu/fr/Document/ced3461ed31ea70a3c416fb648e0cde7/APE8865-3.pdf
pins: 1 VIN, 2 GND, 3 ~{{SHDN}}, 4 BYP, 5 VOUT

## AZ1084-1.2
designator *  value AZ1084-1.2  Reference: U
ki_keywords: Fixed Voltage Regulator 5A Positive LDO; ki_description: 5A 12V Fixed LDO Linear Regulator, 1.2V, TO-220/TO-252/TO-263; ki_fp_filters: TO?220* TO?252* TO?263*; Datasheet: https://www.diodes.com/assets/Datasheets/AZ1084.pdf
pins: 1 GND, 2 VO, 3 VI

## AZ1084-1.5
designator *  value AZ1084-1.5  Reference: U
ki_keywords: Fixed Voltage Regulator 5A Positive LDO; ki_description: 5A 12V Fixed LDO Linear Regulator, 1.5V, TO-220/TO-252/TO-263; ki_fp_filters: TO?220* TO?252* TO?263*; Datasheet: https://www.diodes.com/assets/Datasheets/AZ1084.pdf
pins: 1 GND, 2 VO, 3 VI

## AZ1084-1.8
designator *  value AZ1084-1.8  Reference: U
ki_keywords: Fixed Voltage Regulator 5A Positive LDO; ki_description: 5A 12V Fixed LDO Linear Regulator, 1.5V, TO-220/TO-252/TO-263; ki_fp_filters: TO?220* TO?252* TO?263*; Datasheet: https://www.diodes.com/assets/Datasheets/AZ1084.pdf
pins: 1 GND, 2 VO, 3 VI

## AZ1084-2.5
designator *  value AZ1084-2.5  Reference: U
ki_keywords: Fixed Voltage Regulator 5A Positive LDO; ki_description: 5A 12V Fixed LDO Linear Regulator, 1.5V, TO-220/TO-252/TO-263; ki_fp_filters: TO?220* TO?252* TO?263*; Datasheet: https://www.diodes.com/assets/Datasheets/AZ1084.pdf
pins: 1 GND, 2 VO, 3 VI

## AZ1084-2.85
designator *  value AZ1084-2.85  Reference: U
ki_keywords: Fixed Voltage Regulator 5A Positive LDO; ki_description: 5A 12V Fixed LDO Linear Regulator, 1.5V, TO-220/TO-252/TO-263; ki_fp_filters: TO?220* TO?252* TO?263*; Datasheet: https://www.diodes.com/assets/Datasheets/AZ1084.pdf
pins: 1 GND, 2 VO, 3 VI

## AZ1084-3.3
designator *  value AZ1084-3.3  Reference: U
ki_keywords: Fixed Voltage Regulator 5A Positive LDO; ki_description: 5A 12V Fixed LDO Linear Regulator, 1.5V, TO-220/TO-252/TO-263; ki_fp_filters: TO?220* TO?252* TO?263*; Datasheet: https://www.diodes.com/assets/Datasheets/AZ1084.pdf
pins: 1 GND, 2 VO, 3 VI

## AZ1084-5.0
designator *  value AZ1084-5.0  Reference: U
ki_keywords: Fixed Voltage Regulator 5A Positive LDO; ki_description: 5A 12V Fixed LDO Linear Regulator, 1.5V, TO-220/TO-252/TO-263; ki_fp_filters: TO?220* TO?252* TO?263*; Datasheet: https://www.diodes.com/assets/Datasheets/AZ1084.pdf
pins: 1 GND, 2 VO, 3 VI

## AZ1117-1.2
designator *  value AZ1117-1.2  Reference: U
ki_keywords: Fixed Voltage Regulator 1A Positive LDO; ki_description: 1A 20V Fixed LDO Linear Regulator, 1.2V, SOT-89/SOT-223/TO-220/TO-252/TO-263; ki_fp_filters: SOT?223* SOT?89* TO?220* TO?252* TO?263*; Datasheet: https://www.diodes.com/assets/Datasheets/AZ1117.pdf
pins: 1 GND, 2 VO, 3 VI

## AZ1117-1.5
designator *  value AZ1117-1.5  Reference: U
ki_keywords: Fixed Voltage Regulator 1A Positive LDO; ki_description: 1A 20V Fixed LDO Linear Regulator, 1.5V, SOT-89/SOT-223/TO-220/TO-252/TO-263; ki_fp_filters: SOT?223* SOT?89* TO?220* TO?252* TO?263*; Datasheet: https://www.diodes.com/assets/Datasheets/AZ1117.pdf
pins: 1 GND, 2 VO, 3 VI

## AZ1117-1.8
designator *  value AZ1117-1.8  Reference: U
ki_keywords: Fixed Voltage Regulator 1A Positive LDO; ki_description: 1A 20V Fixed LDO Linear Regulator, 1.8V, SOT-89/SOT-223/TO-220/TO-252/TO-263; ki_fp_filters: SOT?223* SOT?89* TO?220* TO?252* TO?263*; Datasheet: https://www.diodes.com/assets/Datasheets/AZ1117.pdf
pins: 1 GND, 2 VO, 3 VI

## AZ1117-2.5
designator *  value AZ1117-2.5  Reference: U
ki_keywords: Fixed Voltage Regulator 1A Positive LDO; ki_description: 1A 20V Fixed LDO Linear Regulator, 2.5V, SOT-89/SOT-223/TO-220/TO-252/TO-263; ki_fp_filters: SOT?223* SOT?89* TO?220* TO?252* TO?263*; Datasheet: https://www.diodes.com/assets/Datasheets/AZ1117.pdf
pins: 1 GND, 2 VO, 3 VI